# Altium footprint library Connectors SMD.PcbLib: 130 footprints (part 2 of 12)
Each footprint in its own frame and in the unit in brackets; x right, y up, seen from the top. Pads: shape width x height; smd on the part's side, far side on the other; paste and mask are expansions set on the pad; w line width, h text height; cw(c..) or ccw(c..) is an arc to the next point about the centre after c.
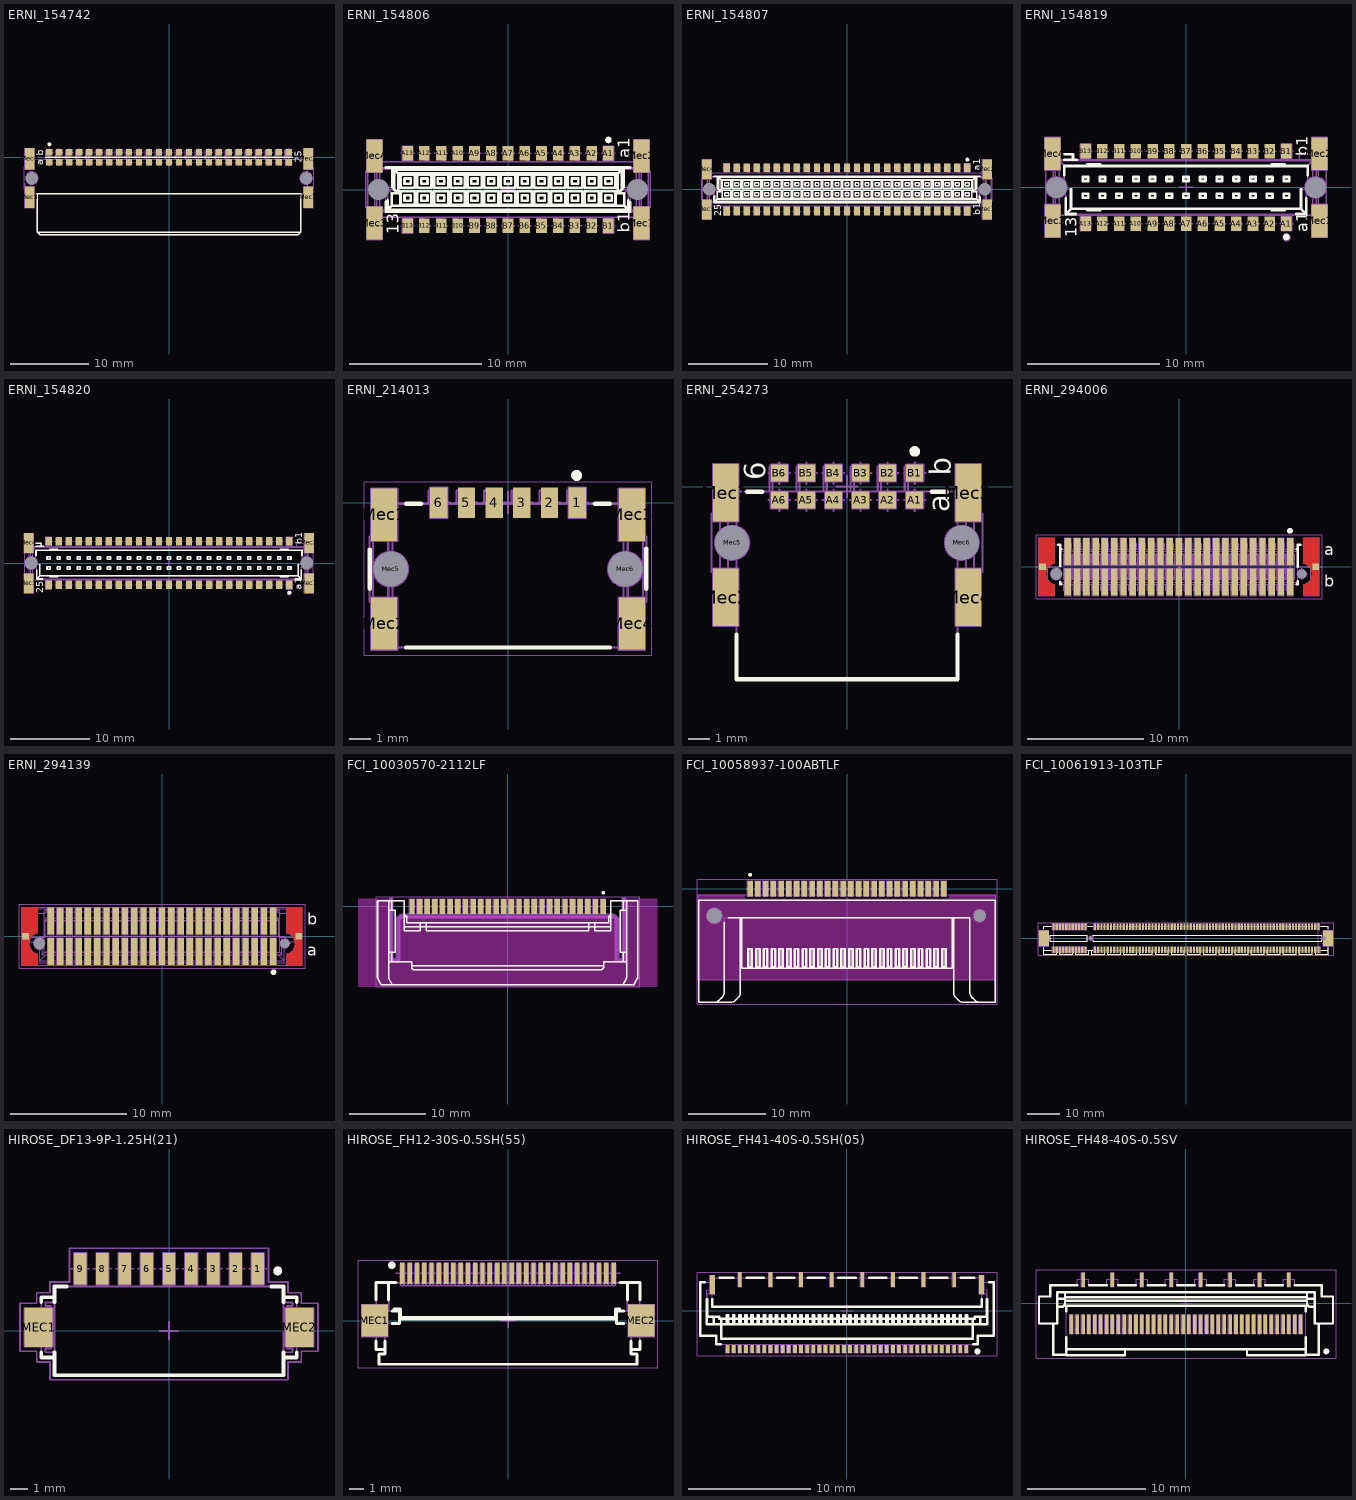
[diagram p1: the footprints below, top view; thin cyan lines are the x and y axes]

## ERNI_154742 [mm] "50 Contacts Pitch 1.27  SMC Right Angle Female Connector Type Q"
height 3.85
pads (56):
  rect 0.8x0.8 smd: A1(-15.24,-0.635) A2(-13.97,-0.635) A3(-12.7,-0.635) A4(-11.43,-0.635) A5(-10.16,-0.635) A6(-8.89,-0.635) A7(-7.62,-0.635) A8(-6.35,-0.635) A9(-5.08,-0.635) A10(-3.81,-0.635) A11(-2.54,-0.635) A12(-1.27,-0.635) A13(0,-0.635) A14(1.27,-0.635) A15(2.54,-0.635) A16(3.81,-0.635) A17(5.08,-0.635) A18(6.35,-0.635) A19(7.62,-0.635) A20(8.89,-0.635) A21(10.16,-0.635) A22(11.43,-0.635) A23(12.7,-0.635) A24(13.97,-0.635) A25(15.24,-0.635) B1(-15.24,0.635) B2(-13.97,0.635) B3(-12.7,0.635) B4(-11.43,0.635) B5(-10.16,0.635) B6(-8.89,0.635) B7(-7.62,0.635) B8(-6.35,0.635) B9(-5.08,0.635) B10(-3.81,0.635) B11(-2.54,0.635) B12(-1.27,0.635) B13(0,0.635) B14(1.27,0.635) B15(2.54,0.635) B16(3.81,0.635) B17(5.08,0.635) B18(6.35,0.635) B19(7.62,0.635) B20(8.89,0.635) B21(10.16,0.635) B22(11.43,0.635) B23(12.7,0.635) B24(13.97,0.635) B25(15.24,0.635)
  rect 1.2x2.7 smd: Mec1(17.75,-5.085) Mec2(17.75,-0.185) Mec3(-17.75,-5.085) Mec4(-17.75,-0.185)
  round 1 hole 1.6 unplated mask+0.3: Mec5(17.45,-2.635) Mec6(-17.45,-2.635)
Top Overlay:
  circle w0.25: c-15.241,1.651 r0.125
  lines w0.2: -16.851,-4.635 16.851,-4.635 ; -16.751,-4.635 -16.751,-9.535 -16.45,-9.835 16.45,-9.835 16.75,-9.535 ; -16.75,-9.535 16.75,-9.535 ; -15.71,-0.005 15.7,-0.005 ; 16.75,-4.635 16.75,-9.535
  text "b" at -15.991,0.235 h0.9
  text "a" at -15.991,-1.035 h0.9
  text "25" at 16.894,-0.7 h0.9
Mechanical 8:
  drawing of 254 lines, arcs and shapes, not listed
Mechanical 14:
  drawing of 164 lines, arcs and shapes, not listed
  text "a" at -15.991,-1.035 h0.9
  text "b" at -15.991,0.235 h0.9
  text "a1" at -15.758,-2.469 h0.9
  text "a25" at 13.869,-2.506 h1
3D body: height 3.86, standoff -0.74, extent -18.416,-9.835 18.416,0.965

## ERNI_154806 [mm] "26 Contacts Pitch 1.27  SMC Straight Female Connector Type B"
height 6.25
pads (32):
  rect 0.8x1.1 smd: A1(7.62,2.75) A2(6.35,2.75) A3(5.08,2.75) A4(3.81,2.75) A5(2.54,2.75) A6(1.27,2.75) A7(0,2.75) A8(-1.27,2.75) A9(-2.54,2.75) A10(-3.81,2.75) A11(-5.08,2.75) A12(-6.35,2.75) A13(-7.62,2.75) B1(7.62,-2.75) B2(6.35,-2.75) B3(5.08,-2.75) B4(3.81,-2.75) B5(2.54,-2.75) B6(1.27,-2.75) B7(0,-2.75) B8(-1.27,-2.75) B9(-2.54,-2.75) B10(-3.81,-2.75) B11(-5.08,-2.75) B12(-6.35,-2.75) B13(-7.62,-2.75)
  rect 1.2x2.5 smd: Mec1(10.13,-2.55) Mec2(10.13,2.55) Mec3(-10.13,-2.55) Mec4(-10.13,2.55)
  round 1 hole 1.6 unplated mask+0.3: Mec5(9.83,0) Mec6(-9.83,0)
Top Overlay:
  drawing of 256 lines, arcs and shapes, not listed
  text "b1" at 9.245,-3.275 h0.9
  text "a1" at 9.245,2.375 h0.9
  text "13" at -8.3,-3.4 h0.9
Mechanical 8:
  drawing of 164 lines, arcs and shapes, not listed
Mechanical 14:
  drawing of 968 lines, arcs and shapes, not listed
  text "b1" at 9.245,-3.275 h0.9
  text "a1" at 9.245,2.375 h0.9
3D body: height 6.25, standoff -0.75, extent -10.795,-3.5 10.795,3.5

## ERNI_154807 [mm] "50 Contacts Pitch 1.27  SMC Straight Female Connector Type B"
height 6.25
pads (56):
  rect 0.8x1.1 smd: A1(15.24,2.75) A2(13.97,2.75) A3(12.7,2.75) A4(11.43,2.75) A5(10.16,2.75) A6(8.89,2.75) A7(7.62,2.75) A8(6.35,2.75) A9(5.08,2.75) A10(3.81,2.75) A11(2.54,2.75) A12(1.27,2.75) A13(0,2.75) A14(-1.27,2.75) A15(-2.54,2.75) A16(-3.81,2.75) A17(-5.08,2.75) A18(-6.35,2.75) A19(-7.62,2.75) A20(-8.89,2.75) A21(-10.16,2.75) A22(-11.43,2.75) A23(-12.7,2.75) A24(-13.97,2.75) A25(-15.24,2.75) B1(15.24,-2.75) B2(13.97,-2.75) B3(12.7,-2.75) B4(11.43,-2.75) B5(10.16,-2.75) B6(8.89,-2.75) B7(7.62,-2.75) B8(6.35,-2.75) B9(5.08,-2.75) B10(3.81,-2.75) B11(2.54,-2.75) B12(1.27,-2.75) B13(0,-2.75) B14(-1.27,-2.75) B15(-2.54,-2.75) B16(-3.81,-2.75) B17(-5.08,-2.75) B18(-6.35,-2.75) B19(-7.62,-2.75) B20(-8.89,-2.75) B21(-10.16,-2.75) B22(-11.43,-2.75) B23(-12.7,-2.75) B24(-13.97,-2.75) B25(-15.24,-2.75)
  rect 1.2x2.5 smd: Mec1(17.75,-2.55) Mec2(17.75,2.55) Mec3(-17.75,-2.55) Mec4(-17.75,2.55)
  round 1 hole 1.6 unplated mask+0.3: Mec5(17.45,0) Mec6(-17.45,0)
Top Overlay:
  drawing of 448 lines, arcs and shapes, not listed
  text "b1" at 16.865,-3.275 h0.9
  text "a1" at 16.865,2.375 h0.9
  text "25" at -15.9,-3.4 h0.9
Mechanical 8:
  drawing of 260 lines, arcs and shapes, not listed
Mechanical 14:
  drawing of 1664 lines, arcs and shapes, not listed
  text "b1" at 16.865,-3.275 h0.9
  text "a1" at 16.865,2.375 h0.9
3D body: height 6.25, standoff -0.75, extent -18.415,-3.5 18.415,3.5

## ERNI_154819 [mm] "26 Contacts Pitch 1.27  SMC Straight Male Connector Type Q"
height 6.7
pads (32):
  rect 0.8x1.1 smd: A1(7.623,-2.75) A2(6.353,-2.75) A3(5.083,-2.75) A4(3.813,-2.75) A5(2.543,-2.75) A6(1.273,-2.75) A7(0.003,-2.75) A8(-1.267,-2.75) A9(-2.537,-2.75) A10(-3.807,-2.75) A11(-5.077,-2.75) A12(-6.347,-2.75) A13(-7.617,-2.75) B1(7.623,2.75) B2(6.353,2.75) B3(5.083,2.75) B4(3.812,2.75) B5(2.542,2.75) B6(1.272,2.75) B7(0.002,2.75) B8(-1.268,2.75) B9(-2.538,2.75) B10(-3.808,2.75) B11(-5.078,2.75) B12(-6.348,2.75) B13(-7.618,2.75)
  rect 1.2x2.5 smd: Mec1(10.133,-2.55) Mec2(10.123,2.55) Mec3(-10.118,-2.55) Mec4(-10.138,2.55)
  round 1 hole 1.6 unplated mask+0.3: Mec5(9.833,0) Mec6(-9.828,0)
Top Overlay:
  circle w0.25: c7.622,-3.766 r0.125
  lines w0.2: -9.23,0.922 -9.23,1.625 ; -9.23,2.1 -8.3,2.1 ; -9.23,2.5 -8.58,2.5 -8.58,2.1 ; -9.13,-0.849 -9.13,-2.025 ; -8.73,-0.15 -8.73,-1.625 ; -8.375,-2.025 -9.13,-2.025 ; -7.5,-1.625 -7.5,-1.75 -6.5,-1.75 -6.5,-1.627 ; -7.5,1.625 -7.5,1.75 -6.5,1.75 -6.5,1.625 ; 6.5,-1.625 6.5,-1.75 7.5,-1.75 7.5,-1.625 ; 6.5,1.625 6.5,1.75 7.5,1.75 7.5,1.625 ; 8.375,-2.025 9.13,-2.025 ; 8.73,-0.15 8.73,-1.625 ; 9.13,-0.849 9.13,-2.025 ; 9.23,0.922 9.23,1.625 -9.23,1.625 ; -9.23,1.625 -9.23,1.625 ; -9.13,-2.025 -8.73,-1.625 ; -8.73,-1.625 8.73,-1.625 ; 8.73,-1.625 9.13,-2.025 ; 9.13,-2.025 9.13,-2.025 ; -7.83,-0.785 -7.83,-0.485 -7.41,-0.485 -7.41,-0.785 -7.83,-0.785 ; -7.83,0.485 -7.83,0.785 -7.41,0.785 -7.41,0.485 -7.83,0.485 ; -6.56,-0.785 -6.56,-0.485 -6.14,-0.485 -6.14,-0.785 -6.56,-0.785 ; -6.56,0.485 -6.14,0.485 -6.14,0.785 -6.56,0.785 -6.56,0.485 ; -5.29,-0.785 -5.29,-0.485 -4.87,-0.485 -4.87,-0.785 -5.29,-0.785 ; -5.29,0.485 -4.87,0.485 -4.87,0.785 -5.29,0.785 -5.29,0.485 ; -4.02,-0.785 -4.02,-0.485 -3.6,-0.485 -3.6,-0.785 -4.02,-0.785 ; -4.02,0.485 -3.6,0.485 -3.6,0.785 -4.02,0.785 -4.02,0.485 ; -2.75,-0.785 -2.75,-0.485 -2.33,-0.485 -2.33,-0.785 -2.75,-0.785 ; -2.75,0.485 -2.33,0.485 -2.33,0.785 -2.75,0.785 -2.75,0.485 ; -1.48,-0.785 -1.48,-0.485 -1.06,-0.485 -1.06,-0.785 -1.48,-0.785 ; -1.48,0.485 -1.06,0.485 -1.06,0.785 -1.48,0.785 -1.48,0.485 ; -0.21,-0.785 -0.21,-0.485 0.21,-0.485 0.21,-0.785 -0.21,-0.785 ; -0.21,0.485 0.21,0.485 0.21,0.785 -0.21,0.785 -0.21,0.485 ; 1.06,-0.785 1.06,-0.485 1.48,-0.485 1.48,-0.785 1.06,-0.785 ; 1.06,0.485 1.48,0.485 1.48,0.785 1.06,0.785 1.06,0.485 ; 2.33,-0.785 2.33,-0.485 2.75,-0.485 2.75,-0.785 2.33,-0.785 ; 2.33,0.485 2.75,0.485 2.75,0.785 2.33,0.785 2.33,0.485 ; 3.6,-0.785 3.6,-0.485 4.02,-0.485 4.02,-0.785 3.6,-0.785 ; 3.6,0.485 4.02,0.485 4.02,0.785 3.6,0.785 3.6,0.485 ; 4.87,-0.785 4.87,-0.485 5.29,-0.485 5.29,-0.785 4.87,-0.785 ; 4.87,0.485 5.29,0.485 5.29,0.785 4.87,0.785 4.87,0.485 ; 6.14,-0.785 6.14,-0.485 6.56,-0.485 6.56,-0.785 6.14,-0.785 ; 6.14,0.485 6.56,0.485 6.56,0.785 6.14,0.785 6.14,0.485 ; 7.41,-0.785 7.41,-0.485 7.83,-0.485 7.83,-0.785 7.41,-0.785 ; 7.41,0.485 7.41,0.785 7.83,0.785 7.83,0.485 7.41,0.485
  text "a1" at 9.232,-3.425 h0.9
  text "b1" at 9.232,2.35 h0.9
  text "13" at -8.303,-3.775 h0.9
Mechanical 8:
  drawing of 167 lines, arcs and shapes, not listed
Mechanical 14:
  drawing of 195 lines, arcs and shapes, not listed
  text "13" at -8.303,-3.775 h0.9
  text "a1" at 9.232,-3.425 h0.9
  text "b1" at 9.232,2.35 h0.9
3D body: height 6.75, standoff -0.75, extent -10.795,-3.6 10.78,3.6

## ERNI_154820 [mm] "50 Contacts Pitch 1.27  SMC Straight Male Connector Type Q"
height 6.75
pads (56):
  rect 0.8x1.1 smd: A1(15.24,-2.75) A2(13.97,-2.75) A3(12.7,-2.75) A4(11.43,-2.75) A5(10.16,-2.75) A6(8.89,-2.75) A7(7.62,-2.75) A8(6.35,-2.75) A9(5.08,-2.75) A10(3.81,-2.75) A11(2.54,-2.75) A12(1.27,-2.75) A13(0,-2.75) A14(-1.27,-2.75) A15(-2.54,-2.75) A16(-3.81,-2.75) A17(-5.08,-2.75) A18(-6.35,-2.75) A19(-7.62,-2.75) A20(-8.89,-2.75) A21(-10.16,-2.75) A22(-11.43,-2.75) A23(-12.7,-2.75) A24(-13.97,-2.75) A25(-15.24,-2.75) B1(15.24,2.75) B2(13.97,2.75) B3(12.7,2.75) B4(11.43,2.75) B5(10.16,2.75) B6(8.89,2.75) B7(7.62,2.75) B8(6.35,2.75) B9(5.08,2.75) B10(3.81,2.75) B11(2.54,2.75) B12(1.27,2.75) B13(0,2.75) B14(-1.27,2.75) B15(-2.54,2.75) B16(-3.81,2.75) B17(-5.08,2.75) B18(-6.35,2.75) B19(-7.62,2.75) B20(-8.89,2.75) B21(-10.16,2.75) B22(-11.43,2.75) B23(-12.7,2.75) B24(-13.97,2.75) B25(-15.24,2.75)
  rect 1.2x2.5 smd: Mec1(17.752,-2.549) Mec2(17.752,2.549) Mec3(-17.752,-2.549) Mec4(-17.752,2.549)
  round 1 hole 1.6 unplated mask+0.3: Mec5(17.452,0) Mec6(-17.453,0)
Top Overlay:
  drawing of 229 lines, arcs and shapes, not listed
  text "b1" at 16.852,2.4 h0.9
  text "a1" at 16.828,-3.4 h0.9
  text "25" at -15.95,-3.825 h0.9
Mechanical 8:
  drawing of 262 lines, arcs and shapes, not listed
Mechanical 14:
  drawing of 291 lines, arcs and shapes, not listed
  text "25" at -15.95,-3.825 h0.9
  text "a1" at 16.825,-3.4 h0.9
  text "b1" at 16.852,2.4 h0.9
3D body: height 6.75, standoff -0.75, extent -18.417,-3.6 18.403,3.6

## ERNI_214013 [mm] "6 Contacts, 1.27mm SRC Type A, Single Row Right Angle Male Connector, MiniBridge Cable System"
height 2.98
pads (12):
  rect 0.8x1.4 smd: 1(3.175,0) 2(1.905,0) 3(0.635,0) 4(-0.635,0) 5(-1.905,0) 6(-3.175,0)
  rect 1.2x2.4 smd: Mec1(-5.685,-0.55) Mec2(-5.685,-5.55) Mec3(5.685,-0.55) Mec4(5.685,-5.55)
  round 1 hole 1.6 unplated mask+0.3: Mec5(-5.385,-3.05) Mec6(5.385,-3.05)
Top Overlay:
  circle w0.25: c3.15,1.25 r0.125
  lines w0.2: -6.35,-3.95 -6.35,-2.15 ; -4.685,-6.65 4.685,-6.65 ; -4.685,-0.05 -3.975,-0.05 ; 3.975,-0.05 4.685,-0.05 ; 6.35,-3.95 6.35,-2.1
Mechanical 8:
  circle w0.1: c-5.385,-3.05 r0.8
  circle w0.1: c5.385,-3.05 r0.8
  lines w0.1: -6.185,-5.55 -5.685,-5.55 ; -6.185,-0.55 -5.685,-0.55 ; -5.885,-3.05 -5.385,-3.05 ; -5.685,-6.05 -5.685,-5.55 ; -5.685,-5.05 -5.685,-5.55 ; -5.685,-1.05 -5.685,-0.55 ; -5.685,-0.05 -5.685,-0.55 ; -5.385,-3.55 -5.385,-3.05 ; -5.385,-2.55 -5.385,-3.05 ; -5.185,-5.55 -5.685,-5.55 ; -5.185,-0.55 -5.685,-0.55 ; -4.885,-3.05 -5.385,-3.05 ; -3.675,0 -3.175,0 ; -3.175,-0.5 -3.175,0 ; -3.175,0.5 -3.175,0 ; -2.675,0 -3.175,0 ; -2.405,0 -1.905,0 ; -1.905,-0.5 -1.905,0 ; -1.905,0.5 -1.905,0 ; -1.405,0 -1.905,0 ; -1.135,0 -0.635,0 ; -0.635,-0.5 -0.635,0 ; -0.635,0.5 -0.635,0 ; -0.5,0 0,0 ; 0,-0.5 0,0 ; 0,0.5 0,0 ; 0.5,0 0,0 ; 0.635,-0.5 0.635,0 ; 0.635,0.5 0.635,0 ; 1.135,0 0.635,0 ; 1.405,0 1.905,0 ; 1.905,-0.5 1.905,0 ; 1.905,0.5 1.905,0 ; 2.405,0 1.905,0 ; 2.675,0 3.175,0 ; 3.175,-0.5 3.175,0 ; 3.175,0.5 3.175,0 ; 3.675,0 3.175,0 ; 4.885,-3.05 5.385,-3.05 ; 5.185,-5.55 5.685,-5.55 ; 5.185,-0.55 5.685,-0.55 ; 5.385,-3.55 5.385,-3.05 ; 5.385,-2.55 5.385,-3.05 ; 5.685,-6.05 5.685,-5.55 ; 5.685,-5.05 5.685,-5.55 ; 5.685,-1.05 5.685,-0.55 ; 5.685,-0.05 5.685,-0.55 ; 5.885,-3.05 5.385,-3.05 ; 6.185,-5.55 5.685,-5.55 ; 6.185,-0.55 5.685,-0.55 ; -6.285,-6.75 -5.085,-6.75 -5.085,-4.35 -6.285,-4.35 -6.285,-6.75 ; -6.285,-1.75 -5.085,-1.75 -5.085,0.65 -6.285,0.65 -6.285,-1.75 ; -3.575,-0.7 -3.575,0.7 -2.775,0.7 -2.775,-0.7 -3.575,-0.7 ; 2.775,-0.7 2.775,0.7 3.575,0.7 3.575,-0.7 2.775,-0.7 ; 5.085,-6.75 6.285,-6.75 6.285,-4.35 5.085,-4.35 5.085,-6.75 ; 5.085,-1.75 5.085,0.65 6.285,0.65 6.285,-1.75 5.085,-1.75
Mechanical 14:
  lines w0.1: -6.203,-4.55 -6.35,-4.55 -6.35,-1.55 -6.196,-1.55 ; -6.2,-5.1 -5.5,-5.1 -5.5,-1 -6.2,-1 ; -5.9,-6.18 -6.2,-6.18 -6.2,-6.65 -5.9,-6.65 ; -5.9,-5.93 -6.2,-5.93 -6.2,-0.17 -5.9,-0.17 ; -5.9,-5.1 -5.9,-6.65 ; -5.9,-1 -5.9,-0.05 5.9,-0.05 5.9,-1 ; -5.85,-0.05 -5.85,0.08 -6.2,0.08 -6.2,0.55 -5.2,0.55 -5.2,-0.05 ; -5.3,-6.65 -5.3,-0.05 ; -3.64,-0.05 -3.64,0.55 -3.02,0.55 cw(c-3.02,0.45) -2.92,0.45 -2.92,-0.05 ; -3.49,-0.05 -3.49,0.55 ; -2.37,-0.05 -2.37,0.55 -1.75,0.55 cw(c-1.75,0.45) -1.65,0.45 -1.65,-0.05 ; -2.22,-0.05 -2.22,0.55 ; -1.1,-0.05 -1.1,0.55 -0.48,0.55 cw(c-0.48,0.45) -0.38,0.45 -0.38,-0.05 ; -0.95,-0.05 -0.95,0.55 ; 0.17,-0.05 0.17,0.55 0.79,0.55 cw(c0.79,0.45) 0.89,0.45 0.89,-0.05 ; 0.32,-0.05 0.32,0.55 ; 1.44,-0.05 1.44,0.55 2.06,0.55 cw(c2.06,0.45) 2.16,0.45 2.16,-0.05 ; 1.59,-0.05 1.59,0.55 ; 2.71,-0.05 2.71,0.55 3.33,0.55 cw(c3.33,0.45) 3.43,0.45 3.43,-0.05 ; 2.86,-0.05 2.86,0.55 ; 5.2,-0.05 5.2,0.55 6.2,0.55 6.2,0.08 5.85,0.08 5.85,-0.05 ; 5.3,-6.65 5.3,-0.05 ; 5.9,-6.18 6.2,-6.18 6.2,-6.65 5.9,-6.65 ; 5.9,-5.93 6.2,-5.93 6.2,-0.17 5.9,-0.17 ; 5.9,-5.1 5.9,-6.65 ; 6.196,-1.55 6.35,-1.55 6.35,-4.55 6.203,-4.55 ; 6.2,-5.1 5.5,-5.1 5.5,-1 6.2,-1 ; -5.9,-6.65 5.9,-6.65
Mechanical 15:
  lines w0.05: -6.604,-7.004 -6.604,0.954 6.604,0.954 6.604,-7.004 -6.604,-7.004
3D body: height 2.98, standoff -0.75, extent -6.35,-6.65 6.35,0.55

## ERNI_254273 [mm] "12 Contacts Pitch 1.27  SMC Right Angle Male Connector Type B"
height 4.2
pads (18):
  rect 0.8x0.8 smd: A1(3.175,-0.635) A2(1.905,-0.635) A3(0.635,-0.635) A4(-0.635,-0.635) A5(-1.905,-0.635) A6(-3.175,-0.635) B1(3.175,0.635) B2(1.905,0.635) B3(0.635,0.635) B4(-0.635,0.635) B5(-1.905,0.635) B6(-3.175,0.635)
  rect 1.2x2.7 smd: Mec1(-5.685,-0.285) Mec2(-5.685,-5.185) Mec3(5.685,-0.285) Mec4(5.685,-5.185)
  round 1 hole 1.6 unplated mask+0.3: Mec5(-5.385,-2.635) Mec6(5.385,-2.635)
Top Overlay:
  circle w0.25: c3.175,1.651 r0.125
  lines w0.2: -5.185,-6.935 -5.185,-9.035 5.185,-9.035 5.185,-6.935 ; -4.685,-0.235 -3.975,-0.235 ; 3.975,-0.235 4.685,-0.235
  text "b" at 4.855,0.5 h1
  text "a" at 4.8,-1.2 h1
  text "6" at -3.845,0.3 h1
Mechanical 8:
  circle w0.1: c-5.385,-2.635 r0.8
  circle w0.1: c5.385,-2.635 r0.8
  lines w0.1: -6.185,-5.185 -5.685,-5.185 ; -6.185,-0.285 -5.685,-0.285 ; -5.885,-2.635 -5.385,-2.635 ; -5.685,-5.685 -5.685,-5.185 ; -5.685,-4.685 -5.685,-5.185 ; -5.685,-0.785 -5.685,-0.285 ; -5.685,0.215 -5.685,-0.285 ; -5.385,-3.135 -5.385,-2.635 ; -5.385,-2.135 -5.385,-2.635 ; -5.185,-5.185 -5.685,-5.185 ; -5.185,-0.285 -5.685,-0.285 ; -4.885,-2.635 -5.385,-2.635 ; -3.675,-0.635 -3.175,-0.635 ; -3.675,0.635 -3.175,0.635 ; -3.175,-1.135 -3.175,-0.635 ; -3.175,-0.135 -3.175,-0.635 ; -3.175,0.135 -3.175,0.635 ; -3.175,1.135 -3.175,0.635 ; -2.675,-0.635 -3.175,-0.635 ; -2.675,0.635 -3.175,0.635 ; -2.405,-0.635 -1.905,-0.635 ; -2.405,0.635 -1.905,0.635 ; -1.905,-1.135 -1.905,-0.635 ; -1.905,-0.135 -1.905,-0.635 ; -1.905,0.135 -1.905,0.635 ; -1.905,1.135 -1.905,0.635 ; -1.405,-0.635 -1.905,-0.635 ; -1.405,0.635 -1.905,0.635 ; -1.135,-0.635 -0.635,-0.635 ; -1.135,0.635 -0.635,0.635 ; -0.635,-1.135 -0.635,-0.635 ; -0.635,-0.135 -0.635,-0.635 ; -0.635,0.135 -0.635,0.635 ; -0.635,1.135 -0.635,0.635 ; -0.5,0 0,0 ; -0.135,-0.635 -0.635,-0.635 ; -0.135,0.635 -0.635,0.635 ; 0,-0.5 0,0 ; 0,0.5 0,0 ; 0.135,-0.635 0.635,-0.635 ; 0.135,0.635 0.635,0.635 ; 0.5,0 0,0 ; 0.635,-1.135 0.635,-0.635 ; 0.635,-0.135 0.635,-0.635 ; 0.635,0.135 0.635,0.635 ; 0.635,1.135 0.635,0.635 ; 1.135,-0.635 0.635,-0.635 ; 1.135,0.635 0.635,0.635 ; 1.405,-0.635 1.905,-0.635 ; 1.405,0.635 1.905,0.635 ; 1.905,-1.135 1.905,-0.635 ; 1.905,-0.135 1.905,-0.635 ; 1.905,0.135 1.905,0.635 ; 1.905,1.135 1.905,0.635 ; 2.405,-0.635 1.905,-0.635 ; 2.405,0.635 1.905,0.635 ; 2.675,-0.635 3.175,-0.635 ; 2.675,0.635 3.175,0.635 ; 3.175,-1.135 3.175,-0.635 ; 3.175,-0.135 3.175,-0.635 ; 3.175,0.135 3.175,0.635 ; 3.175,1.135 3.175,0.635 ; 3.675,-0.635 3.175,-0.635 ; 3.675,0.635 3.175,0.635 ; 4.885,-2.635 5.385,-2.635 ; 5.185,-5.185 5.685,-5.185 ; 5.185,-0.285 5.685,-0.285 ; 5.385,-3.135 5.385,-2.635 ; 5.385,-2.135 5.385,-2.635 ; 5.685,-5.685 5.685,-5.185 ; 5.685,-4.685 5.685,-5.185 ; 5.685,-0.785 5.685,-0.285 ; 5.685,0.215 5.685,-0.285 ; 5.885,-2.635 5.385,-2.635 ; 6.185,-5.185 5.685,-5.185 ; 6.185,-0.285 5.685,-0.285 ; -6.285,-6.535 -5.085,-6.535 -5.085,-3.835 -6.285,-3.835 -6.285,-6.535 ; -6.285,-1.635 -6.285,1.065 -5.085,1.065 -5.085,-1.635 -6.285,-1.635 ; -3.575,-1.035 -2.775,-1.035 -2.775,-0.235 -3.575,-0.235 -3.575,-1.035 ; -3.575,0.235 -2.775,0.235 -2.775,1.035 -3.575,1.035 -3.575,0.235 ; -2.305,-1.035 -1.505,-1.035 -1.505,-0.235 -2.305,-0.235 -2.305,-1.035 ; -2.305,0.235 -1.505,0.235 -1.505,1.035 -2.305,1.035 -2.305,0.235 ; -1.035,-1.035 -0.235,-1.035 -0.235,-0.235 -1.035,-0.235 -1.035,-1.035 ; -1.035,0.235 -0.235,0.235 -0.235,1.035 -1.035,1.035 -1.035,0.235 ; 0.235,-1.035 1.035,-1.035 1.035,-0.235 0.235,-0.235 0.235,-1.035 ; 0.235,0.235 1.035,0.235 1.035,1.035 0.235,1.035 0.235,0.235 ; 1.505,-1.035 2.305,-1.035 2.305,-0.235 1.505,-0.235 1.505,-1.035 ; 1.505,0.235 2.305,0.235 2.305,1.035 1.505,1.035 1.505,0.235 ; 2.775,-1.035 3.575,-1.035 3.575,-0.235 2.775,-0.235 2.775,-1.035 ; 2.775,0.235 3.575,0.235 3.575,1.035 2.775,1.035 2.775,0.235 ; 5.085,-6.535 6.285,-6.535 6.285,-3.835 5.085,-3.835 5.085,-6.535 ; 5.085,-1.635 5.085,1.065 6.285,1.065 6.285,-1.635 5.085,-1.635
Mechanical 14:
  drawing of 628 lines, arcs and shapes, not listed
  text "a" at 4.8,-1.2 h1
  text "b" at 4.855,0.5 h1
  text "a1" at 2.7,-2.8 h1
  text "a6" at -4,-2.8 h1
  text "6" at -3.845,0.3 h1
3D body: height 4.25, standoff -0.75, extent -6.35,-9.035 6.35,0.965

## ERNI_294006 [mm] "50 Contacts Pitch 0.8  SMT Vertical Female Connector Type MicroCon"
height 4
pads (54):
  rect 0.55x2.35 smd: A1(9.6,1.325) A2(8.8,1.325) A3(8,1.325) A4(7.2,1.325) A5(6.4,1.325) A6(5.6,1.325) A7(4.8,1.325) A8(4,1.325) A9(3.2,1.325) A10(2.4,1.325) A11(1.6,1.325) A12(0.8,1.325) A13(0,1.325) A14(-0.8,1.325) A15(-1.6,1.325) A16(-2.4,1.325) A17(-3.2,1.325) A18(-4,1.325) A19(-4.8,1.325) A20(-5.6,1.325) A21(-6.4,1.325) A22(-7.2,1.325) A23(-8,1.325) A24(-8.8,1.325) A25(-9.6,1.325) B1(9.6,-1.325) B2(8.8,-1.325) B3(8,-1.325) B4(7.2,-1.325) B5(6.4,-1.325) B6(5.6,-1.325) B7(4.8,-1.325) B8(4,-1.325) B9(3.2,-1.325) B10(2.4,-1.325) B11(1.6,-1.325) B12(0.8,-1.325) B13(0,-1.325) B14(-0.8,-1.325) B15(-1.6,-1.325) B16(-2.4,-1.325) B17(-3.2,-1.325) B18(-4,-1.325) B19(-4.8,-1.325) B20(-5.6,-1.325) B21(-6.4,-1.325) B22(-7.2,-1.325) B23(-8,-1.325) B24(-8.8,-1.325) B25(-9.6,-1.325)
  rect 0.6x0.6 smd: MEC1(-11.8,0) MEC2(11.8,0)
  round 0.5 hole 0.8 unplated mask+0.15: Mec5(10.6,-0.625)
  round 0.5 hole 1 unplated mask+0.25: Mec6(-10.6,-0.625)
Top Layer:
  region: 10.75,-2.5 12.1,-2.5 12.1,2.5 10.75,2.5 10.75,0.263 10.835,0.252 11.054,0.161 11.242,0.017 11.386,-0.171 11.477,-0.39 11.508,-0.625 11.477,-0.86 11.386,-1.079 11.242,-1.267 11.054,-1.411 10.835,-1.502 10.75,-1.513 10.75,-1.512
  region: -12.1,-2.5 -10.75,-2.5 -10.75,-1.513 -10.835,-1.502 -11.054,-1.411 -11.242,-1.267 -11.386,-1.079 -11.477,-0.86 -11.508,-0.625 -11.477,-0.39 -11.386,-0.171 -11.242,0.017 -11.054,0.161 -10.835,0.252 -10.75,0.263 -10.75,0.262 -10.75,2.5 -12.1,2.5
Top Overlay:
  circle w0.25: c9.575,3.101 r0.125
  lines w0.2: -10.45,1.9 -10.25,1.9 -10.25,0.094 ; -10.25,-1.344 -10.25,-1.5 -10.175,-1.5 ; -10.25,1.5 -10.175,1.5 ; 10.175,-1.5 10.25,-1.5 10.25,-1.231 ; 10.175,1.5 10.25,1.5 ; 10.25,0 10.25,1.9 10.45,1.9
  text "a" at 12.55,1 h1
  text "b" at 12.525,-1.705 h1
Mechanical 8:
  drawing of 338 lines, arcs and shapes, not listed
Mechanical 14:
  drawing of 978 lines, arcs and shapes, not listed
  text "a" at 12.55,1 h1
  text "b" at 12.525,-1.705 h1
Mechanical 15:
  lines w0.05: -12.35,-2.75 -12.35,2.75 12.35,2.75 12.35,-2.75 -12.35,-2.75
3D body: height 4.6, standoff -0.7, extent -11.95,-2.35 11.95,2.35
